# Altium footprint library PCBLibrary.PcbLib: 90 footprints (part 4 of 6)
Each footprint in its own frame and in the unit in brackets; x right, y up, seen from the top. Pads: shape width x height; smd on the part's side, far side on the other; paste and mask are expansions set on the pad; w line width, h text height; cw(c..) or ccw(c..) is an arc to the next point about the centre after c.
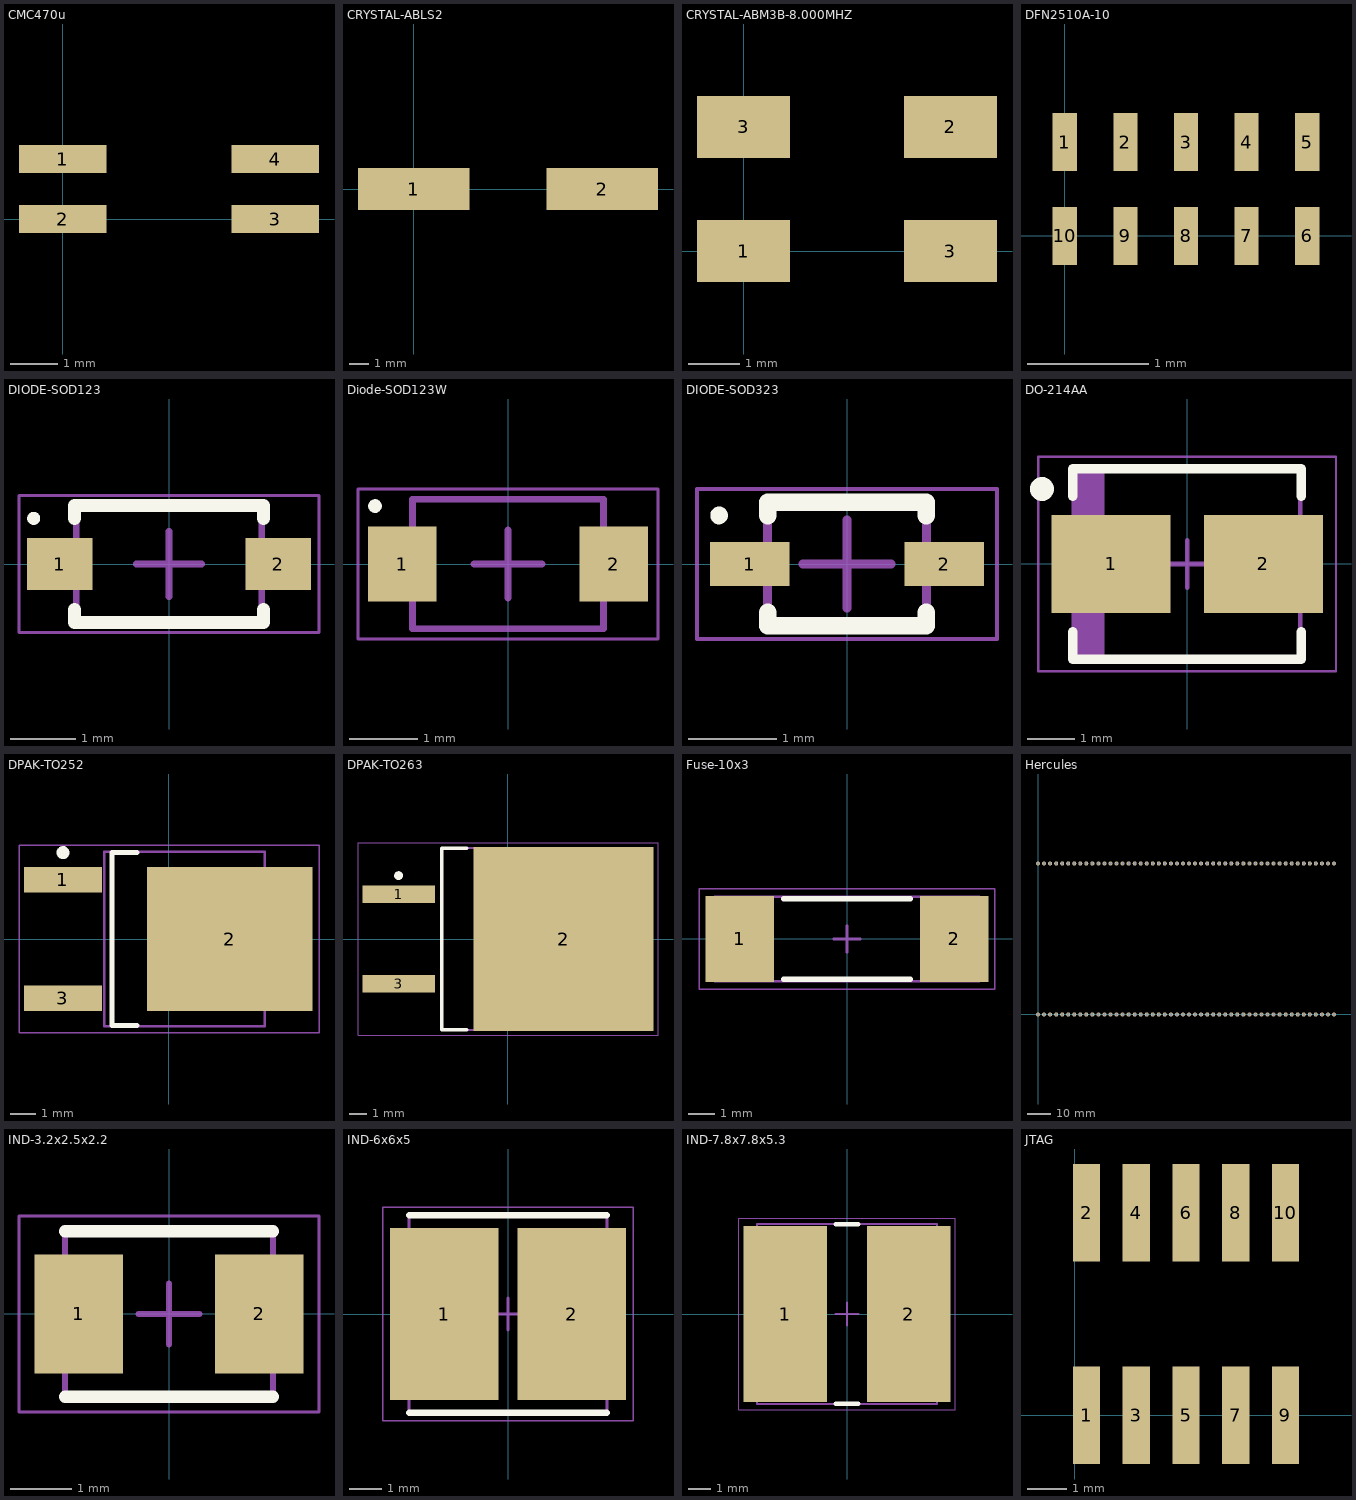
[diagram p3: the footprints below, top view; thin cyan lines are the x and y axes]

## CMC470u [mm]
pads (4):
  rect 1.85x0.6 smd: 1(0,1.27) 2(0,0) 3(4.5,0) 4(4.5,1.27)
3D body "744242101_Download_STP_WE-SLM_rev1.stp": height 3.25, standoff 0, extent -0.75,-1.015 5.25,2.285

## CRYSTAL-ABLS2 [mm]
pads (2):
  rect 5.6x2.1 smd: 1(0,0) 2(9.5,0)
3D body "ABLS2.STEP": height 3.24, standoff -0.02, extent -1.6,-2.349 11.1,2.35

## CRYSTAL-ABM3B-8.000MHZ [mm]
pads (4):
  rect 1.8x1.2 smd: 1(0,0) 2(4,2.4) 3(0,2.4) 3(4,0)
3D body "ABM3B.STEP": height 1.1, standoff -0.01, extent -0.5,-0.387 4.5,2.788

## DFN2510A-10 [mm]
pads (10):
  rect 0.2x0.475 smd paste+0 mask+0.05: 1(0,0.775) 2(0.5,0.775) 3(1,0.775) 4(1.5,0.775) 5(2,0.775) 6(2,0) 7(1.5,0) 8(1,0) 9(0.5,0) 10(0,0)
3D body: height 0.5, standoff 0, extent -0.225,-0.363 2.225,1.137
3D body: height 0.25, standoff 0, extent 3.1,0.5 3.1,0.5
3D body: height 0.25, standoff 0, extent 2.4,1 2.4,1

## DIODE-SOD123 [mm] "SODFL, 2-Leads, Body 1.60x3.70mm, IPC Medium Density"
height 1.35
pads (2):
  rect 1x0.8 smd: 1(-1.675,0) 2(1.675,0)
Top Overlay:
  circle w0.1: c-2.075,0.7 r0.05
  lines w0.2: -1.45,-0.7 -1.45,-0.9 1.45,-0.9 1.45,-0.7 ; -1.45,0.7 -1.45,0.9 1.45,0.9 1.45,0.7
Mechanical 13:
  lines w0.1: -1.425,-0.9 1.425,-0.9 1.425,0.9 -1.425,0.9 -1.425,-0.9
Mechanical 15:
  lines w0.05: -2.3,-1.05 2.3,-1.05 2.3,1.05 -2.3,1.05 -2.3,-1.05
  lines w0.1: -0.5,0 0.5,0 ; 0,-0.5 0,0.5
3D body "SODFL370X135-2N.step": height 1.35, standoff 0, extent -1.85,-0.9 1.85,0.9

## Diode-SOD123W [mm] "SODFL, 2-Leads, Body 1.70x3.50mm, IPC Medium Density"
height 1.1
pads (2):
  rect 1x1.1 smd: 1(-1.55,0) 2(1.55,0)
Top Overlay:
  circle w0.1: c-1.95,0.85 r0.05
Mechanical 13:
  lines w0.1: -1.4,-0.95 1.4,-0.95 1.4,0.95 -1.4,0.95 -1.4,-0.95
Mechanical 15:
  lines w0.05: -2.2,-1.1 2.2,-1.1 2.2,1.1 -2.2,1.1 -2.2,-1.1
  lines w0.1: -0.5,0 0.5,0 ; 0,-0.5 0,0.5
3D body "SODFL350X110-2N.step": height 1.1, standoff 0, extent -1.75,-0.95 1.75,0.95

## DIODE-SOD323 [mm] "SODFL, 2-Leads, Body 1.25x2.50mm, IPC Medium Density"
height 1.1
pads (2):
  rect 0.9x0.5 smd: 1(-1.1,0) 2(1.1,0)
Top Overlay:
  circle w0.1: c-1.45,0.55 r0.05
  lines w0.2: -0.9,-0.55 -0.9,-0.7 0.9,-0.7 0.9,-0.55 ; -0.9,0.55 -0.9,0.7 0.9,0.7 0.9,0.55
Mechanical 13:
  lines w0.1: -0.9,-0.675 -0.9,0.675 0.9,0.675 0.9,-0.675 -0.9,-0.675
Mechanical 15:
  lines w0.05: -1.7,-0.85 -1.7,0.85 1.7,0.85 1.7,-0.85 -1.7,-0.85
  lines w0.1: -0.5,0 0.5,0 ; 0,-0.5 0,0.5
3D body "SODFL250X110-2N.step": height 1.1, standoff 0, extent -1.25,-0.675 1.25,0.675

## DO-214AA [mm] "Molded Diode, 2-Leads, Body 4.40x3.62mm, IPC Medium Density"
height 2.41
pads (2):
  rect 2.5x2.05 smd: 1(-1.6,0) 2(1.6,0)
Top Overlay:
  circle w0.25: c-3.05,1.575 r0.125
  lines w0.2: -2.4,-1.425 -2.4,-2 2.4,-2 2.4,-1.425 ; -2.4,1.425 -2.4,2 2.4,2 2.4,1.425
Mechanical 13:
  rectangle: -2.375,-1.97 -1.736,1.97
  lines w0.1: -2.375,-1.97 -2.375,1.97 2.375,1.97 2.375,-1.97 -2.375,-1.97
Mechanical 15:
  lines w0.05: -3.125,-2.25 -3.125,2.25 3.125,2.25 3.125,-2.25 -3.125,-2.25
  lines w0.1: -0.5,0 0.5,0 ; 0,-0.5 0,0.5
3D body "DIOM4436X24N.step": height 2.41, standoff 0, extent -2.595,-1.97 2.595,1.97

## DPAK-TO252 [mm] "D-PAK, 3-Pads, Body 6.20x6.73mm (max), IPC Medium Density"
height 2.38
pads (3):
  rect 3x1 smd: 1(-4.1,2.29) 3(-4.1,-2.29)
  rect 6.4x5.55 smd: 2(2.35,0)
Top Overlay:
  circle w0.25: c-4.1,3.34 r0.125
  lines w0.2: -1.25,-3.35 -2.2,-3.35 -2.2,3.35 -1.25,3.35
Mechanical 13:
  lines w0.1: -2.5,-3.375 -2.5,3.375 3.7,3.375 3.7,-3.375 -2.5,-3.375
Mechanical 15:
  lines w0.05: -5.8,-3.625 -5.8,3.625 5.8,3.625 5.8,-3.625 -5.8,-3.625
  lines w0.1: -0.5,0 0.5,0 ; 0,-0.5 0,0.5
3D body "DPAK229P990X238-3N.step": height 2.38, standoff 0, extent -4.575,-3.375 5.325,3.375

## DPAK-TO263 [mm] "D2-PAK, 3-Pads, Body 8.00x8.51mm (max), IPC Medium Density"
height 4.5
pads (3):
  rect 4.1x1 smd: 1(-6.2,2.54) 3(-6.2,-2.54)
  rect 10.2x10.4 smd: 2(3.15,0)
Top Overlay:
  circle w0.25: c-6.2,3.59 r0.125
  lines w0.2: -2.35,-5.15 -3.75,-5.15 -3.75,5.15 -2.35,5.15
Mechanical 13:
  lines w0.1: -3.75,-5.15 -3.75,5.15 6.05,5.15 6.05,-5.15 -3.75,-5.15
Mechanical 15:
  lines w0.05: -8.5,-5.45 -8.5,5.45 8.5,5.45 8.5,-5.45 -8.5,-5.45
  lines w0.1: -0.5,0 0.5,0 ; 0,-0.5 0,0.5
3D body "DPAK254P1530X450-3N.step": height 4.5, standoff 0, extent -7.45,-5.15 7.85,5.15

## Fuse-10x3 [mm] "Chip Inductor, 2-Leads, Body 9.80x3.10mm, IPC Medium Density"
height 3.2
pads (2):
  rect 2.59x3.24 smd: 1(-4.06,0) 2(4.06,0)
Top Overlay:
  lines w0.2: -2.4,-1.52 2.4,-1.52 ; -2.4,1.52 2.4,1.52
Mechanical 13:
  lines w0.1: -5,-1.6 5,-1.6 5,1.6 -5,1.6 -5,-1.6
Mechanical 15:
  lines w0.05: -5.6,-1.9 5.6,-1.9 5.6,1.9 -5.6,1.9 -5.6,-1.9
  lines w0.1: -0.5,0 0.5,0 ; 0,-0.5 0,0.5
3D body "INDC9831X32N.step": height 3.2, standoff 0, extent -5,-1.6 5,1.6

## Hercules [mm]
pads (100):
  round 1.7 hole 1.1: 1(0,0) 2(2.54,0) 3(5.08,0) 4(7.62,0) 5(10.16,0) 6(12.7,0) 7(15.24,0) 8(17.78,0) 9(20.32,0) 10(22.86,0) 11(25.4,0) 12(27.94,0) 13(30.48,0) 14(33.02,0) 15(35.56,0) 16(38.1,0) 17(40.64,0) 18(43.18,0) 19(45.72,0) 20(48.26,0) 21(50.8,0) 22(53.34,0) 23(55.88,0) 24(58.42,0) 25(60.96,0) 26(63.5,0) 27(66.04,0) 28(68.58,0) 29(71.12,0) 30(73.66,0) 31(76.2,0) 32(78.74,0) 33(81.28,0) 34(83.82,0) 35(86.36,0) 36(88.9,0) 37(91.44,0) 38(93.98,0) 39(96.52,0) 40(99.06,0) 41(101.6,0) 42(104.14,0) 43(106.68,0) 44(109.22,0) 45(111.76,0) 46(114.3,0) 47(116.84,0) 48(119.38,0) 49(121.92,0) 50(124.46,0) 51(0,63.5) 52(2.54,63.5) 53(5.08,63.5) 54(7.62,63.5) 55(10.16,63.5) 56(12.7,63.5) 57(15.24,63.5) 58(17.78,63.5) 59(20.32,63.5) 60(22.86,63.5) 61(25.4,63.5) 62(27.94,63.5) 63(30.48,63.5) 64(33.02,63.5) 65(35.56,63.5) 66(38.1,63.5) 67(40.64,63.5) 68(43.18,63.5) 69(45.72,63.5) 70(48.26,63.5) 71(50.8,63.5) 72(53.34,63.5) 73(55.88,63.5) 74(58.42,63.5) 75(60.96,63.5) 76(63.5,63.5) 77(66.04,63.5) 78(68.58,63.5) 79(71.12,63.5) 80(73.66,63.5) 81(76.2,63.5) 82(78.74,63.5) 83(81.28,63.5) 84(83.82,63.5) 85(86.36,63.5) 86(88.9,63.5) 87(91.44,63.5) 88(93.98,63.5) 89(96.52,63.5) 90(99.06,63.5) 91(101.6,63.5) 92(104.14,63.5) 93(106.68,63.5) 94(109.22,63.5) 95(111.76,63.5) 96(114.3,63.5) 97(116.84,63.5) 98(119.38,63.5) 99(121.92,63.5) 100(124.46,63.5)

## IND-3.2x2.5x2.2 [mm] "Molded Inductor, 2-Leads, Body 3.20x2.50mm, IPC Medium Density"
height 2.4
pads (2):
  rect 1.45x1.95 smd: 1(-1.475,0) 2(1.475,0)
Top Overlay:
  lines w0.2: -1.7,-1.35 1.7,-1.35 ; -1.7,1.35 1.7,1.35
Mechanical 13:
  lines w0.1: -1.7,-1.35 -1.7,1.35 1.7,1.35 1.7,-1.35 -1.7,-1.35
Mechanical 15:
  lines w0.05: -2.45,-1.6 -2.45,1.6 2.45,1.6 2.45,-1.6 -2.45,-1.6
  lines w0.1: -0.5,0 0.5,0 ; 0,-0.5 0,0.5
3D body "INDM3225X24N.step": height 2.4, standoff 0, extent -1.92,-1.35 1.92,1.35

## IND-6x6x5 [mm] "Precision Wire Wound Inductor, 2-Leads, Body 6.00x6.00mm, IPC Medium Density"
height 5
pads (2):
  rect 3.4x5.4 smd: 1(-2,0) 2(2,0)
Top Overlay:
  lines w0.2: -3.1,-3.1 3.1,-3.1 ; -3.1,3.1 3.1,3.1
Mechanical 13:
  lines w0.1: -3.1,-3.1 -3.1,3.1 3.1,3.1 3.1,-3.1 -3.1,-3.1
Mechanical 15:
  lines w0.05: -3.925,-3.35 -3.925,3.35 3.925,3.35 3.925,-3.35 -3.925,-3.35
  lines w0.1: -0.5,0 0.5,0 ; 0,-0.5 0,0.5
3D body "INDP6060X50N.step": height 5.1, standoff 0, extent -3.1,-3 3.1,3

## IND-7.8x7.8x5.3 [mm] "Precision Wire Wound Inductor, 2-Leads, Body 7.80x7.80mm, IPC Medium Density"
height 5.3
pads (2):
  rect 3.7x7.85 smd: 1(-2.75,0) 2(2.75,0)
Top Overlay:
  lines w0.2: -0.5,-4 0.5,-4 ; -0.5,4 0.5,4
Mechanical 13:
  lines w0.1: -4,-4 4,-4 4,4 -4,4 -4,-4
Mechanical 15:
  lines w0.05: -4.825,-4.25 4.825,-4.25 4.825,4.25 -4.825,4.25 -4.825,-4.25
  lines w0.1: -0.5,0 0.5,0 ; 0,-0.5 0,0.5
3D body "INDP7878X53N.step": height 5.4, standoff 0, extent -4,-3.9 4,3.9

## JTAG [mm]
pads (10):
  rect 0.7x2.5 smd: 1(0.3,0) 2(0.3,5.205) 3(1.577,0) 4(1.577,5.205) 5(2.855,0) 6(2.855,5.205) 7(4.132,0) 8(4.132,5.205) 9(5.41,0) 10(5.41,5.205)
3D body "FTSH-105-01-F-DV-K-TR--3DModel-STEP-56544.STEP": height 6.11, standoff -0.01, extent -0.31,-0.321 6.04,5.521